# Altium footprint library IC_QFN.PcbLib: 25 footprints (part 1 of 3)
Each footprint in its own frame and in the unit in brackets; x right, y up, seen from the top. Pads: shape width x height; smd on the part's side, far side on the other; paste and mask are expansions set on the pad; w line width, h text height; cw(c..) or ccw(c..) is an arc to the next point about the centre after c.
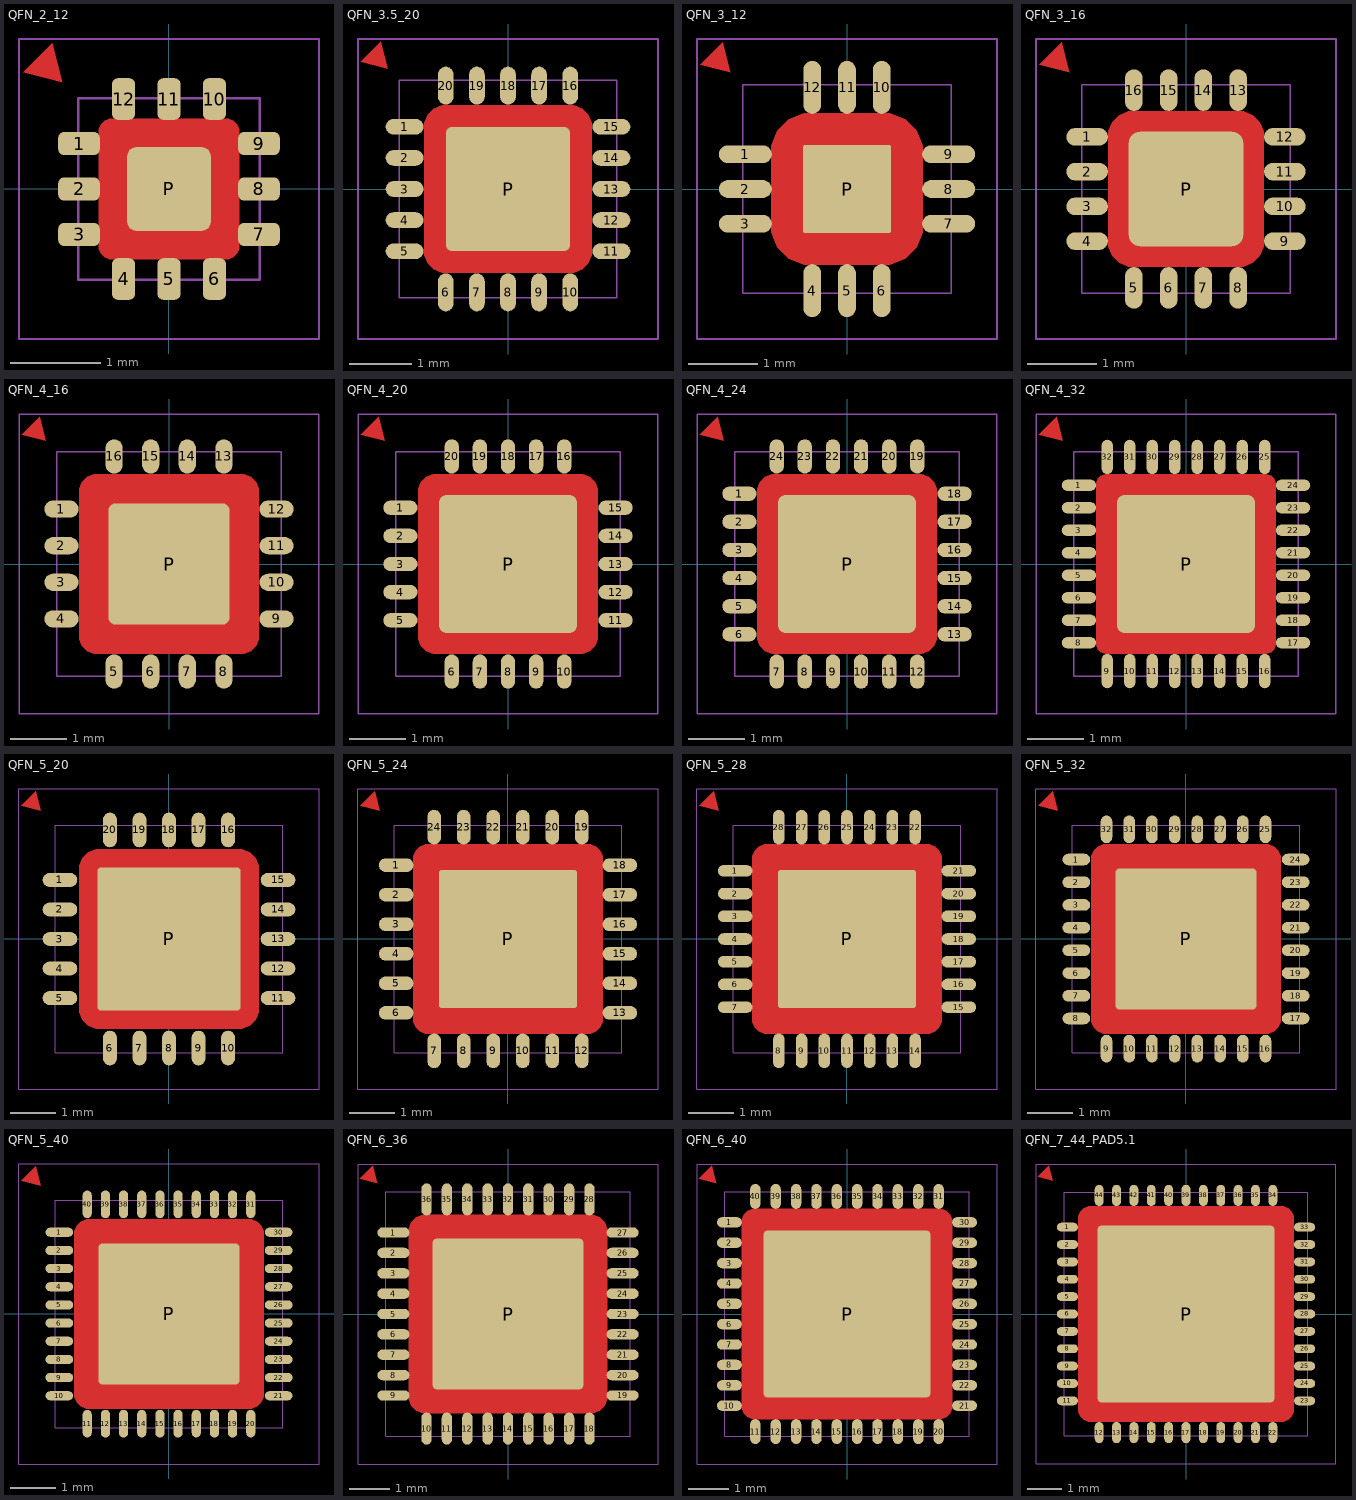
[diagram p0: the footprints below, top view; thin cyan lines are the x and y axes]

## QFN_2_12 [mil]
pads (13):
  rrect50% 18x10 smd mask+2: 1(-39,19.69) 2(-39,0) 3(-39,-19.68) 7(39,-19.69) 8(39,0) 9(39,19.68)
  rrect50% 10x18 smd mask+2: 4(-19.69,-39) 5(0,-39) 6(19.68,-39) 10(19.69,39) 11(0,39) 12(-19.68,39)
  rrect20% 36.22x36.22 smd paste-100 mask+2: P(0,0)
Top Layer:
  pour cut-out: -24.69,30.37 -25.82,30.37 -27.91,29.5 -29.5,27.91 -30.37,25.82 -30.37,24.69 -30.37,-24.69 -30.37,-25.82 -29.5,-27.91 -27.91,-29.5 -25.82,-30.37 -24.69,-30.37 24.69,-30.37 25.82,-30.37 27.91,-29.5 29.5,-27.91 30.37,-25.82 30.37,-24.69 30.37,24.69 30.37,25.82 29.5,27.91 27.91,29.5 25.82,30.37 24.69,30.37
  region: -46.26,46.26 -50.5,63.23 -63.23,50.51
Top Paste:
  region: 3,3 18,3 18,14 14,18 3,18
  region: 3,-3 3,-18 14,-18 18,-14 18,-3
  region: -3,-3 -18,-3 -18,-14 -14,-18 -3,-18
  region: -3,3 -3,18 -14,18 -18,14 -18,3
Top Component Outline:
  lines w1: -65,-65 65,-65 65,65 -65,65 -65,-65
Top 3D Body (Mech16):
  lines w1: -39.37,-39.37 -39.37,39.37 39.37,39.37 39.37,-39.37 -39.37,-39.37
3D body: height 21, standoff 0, extent -39.37,-39.37 39.37,39.37
3D body: height 10, standoff 0, extent 14.69,-40.37 24.68,-30.37
3D body: height 10, standoff 0, extent -5,-40.37 5,-30.37
3D body: height 10, standoff 0, extent -24.69,-40.37 -14.69,-30.37
3D body: height 10, standoff 0, extent -40.37,-24.68 -30.37,-14.69
3D body: height 10, standoff 0, extent -40.37,-5 -30.37,5
3D body: height 10, standoff 0, extent -40.37,14.69 -30.37,24.69
3D body: height 10, standoff 0, extent 30.37,-24.69 40.37,-14.69
3D body: height 10, standoff 0, extent 30.37,-5 40.37,5
3D body: height 10, standoff 0, extent 30.37,14.69 40.37,24.68
3D body: height 10, standoff 0, extent 14.69,30.37 24.69,40.37
3D body: height 10, standoff 0, extent -5,30.37 5,40.37
3D body: height 10, standoff 0, extent -24.68,30.37 -14.69,40.37

## QFN_3.5_20 [mil]
pads (21):
  oval 24x10 smd mask+2: 1(-65.47,39.37) 2(-65.47,19.68) 3(-65.47,0) 4(-65.47,-19.68) 5(-65.47,-39.37) 11(65.47,-39.37) 12(65.47,-19.68) 13(65.47,0) 14(65.47,19.69) 15(65.47,39.37)
  oval 10x24 smd mask+2: 6(-39.37,-65.47) 7(-19.69,-65.47) 8(0,-65.47) 9(19.68,-65.47) 10(39.37,-65.47) 16(39.37,65.47) 17(19.68,65.47) 18(0,65.47) 19(-19.69,65.47) 20(-39.37,65.47)
  rrect10% 78.74x78.74 smd paste-100 mask+2: P(0,0)
Top Layer:
  region: -76.26,76.26 -80.5,93.23 -93.23,80.51
  pour cut-out: -39.37,-53 -42.08,-53 -47.09,-50.92 -50.92,-47.09 -53,-42.08 -53,-39.37 -53,39.37 -53,42.08 -50.92,47.09 -47.09,50.92 -42.08,53 -39.37,53 39.37,53 42.08,53 47.09,50.92 50.92,47.09 53,42.08 53,39.37 53,-39.37 53,-42.08 50.92,-47.09 47.09,-50.92 42.08,-53 39.37,-53
Top Paste:
  region: 37,-6 6,-6 6,-36 37,-36
  region: -6,-36 -6,-6 -36,-6 -36,-36
  rectangle: -37,6 -6,37
  region: 6,37 6,6 37,6 37,37
Top Component Outline:
  lines w1: -95,-95 95,-95 95,95 -95,95 -95,-95
Top 3D Body (Mech16):
  lines w1: -68.9,-68.9 -68.9,68.9 68.9,68.9 68.9,-68.9 -68.9,-68.9
3D body: height 10, standoff 0, extent -44.37,-69.16 -34.37,-59.16
3D body: height 10, standoff 0, extent -24.68,-69.16 -14.68,-59.16
3D body: height 10, standoff 0, extent -5,-69.16 5,-59.16
3D body: height 10, standoff 0, extent 14.69,-69.16 24.69,-59.16
3D body: height 10, standoff 0, extent 34.37,-69.16 44.37,-59.16
3D body: height 10, standoff 0, extent -69.16,34.37 -59.16,44.37
3D body: height 10, standoff 0, extent -69.16,14.68 -59.16,24.68
3D body: height 10, standoff 0, extent -69.16,-5 -59.16,5
3D body: height 10, standoff 0, extent -69.16,-24.69 -59.16,-14.69
3D body: height 10, standoff 0, extent -69.16,-44.37 -59.16,-34.37
3D body: height 10, standoff 0, extent 34.37,59.16 44.37,69.16
3D body: height 10, standoff 0, extent 14.69,59.16 24.69,69.16
3D body: height 10, standoff 0, extent -5,59.16 5,69.16
3D body: height 10, standoff 0, extent -24.68,59.16 -14.68,69.16
3D body: height 10, standoff 0, extent -44.37,59.16 -34.37,69.16
3D body: height 10, standoff 0, extent 59.16,34.37 69.16,44.37
3D body: height 10, standoff 0, extent 59.16,14.68 69.16,24.68
3D body: height 10, standoff 0, extent 59.16,-5 69.16,5
3D body: height 10, standoff 0, extent 59.16,-24.69 69.16,-14.69
3D body: height 10, standoff 0, extent 59.16,-44.37 69.16,-34.37
3D body: height 35, standoff 0, extent -68.9,-68.9 68.9,68.9

## QFN_3_12 [mil]
pads (13):
  oval 30x10 smd mask+2: 1(-57.58,19.69) 2(-57.58,0) 3(-57.58,-19.68) 7(57.58,-19.68) 8(57.58,0) 9(57.58,19.69)
  oval 10x30 smd mask+2: 4(-19.69,-57.58) 5(0,-57.58) 6(19.68,-57.58) 10(19.68,57.58) 11(0,57.58) 12(-19.69,57.58)
  rrect5% 50x50 smd paste-100 mask+2: P(0,0)
Top Layer:
  region: -66.26,66.26 -70.5,83.23 -83.23,70.51
  pour cut-out: -20,43 -24.57,43 -33.03,39.5 -39.5,33.03 -43,24.57 -43,20 -43,-20 -43,-24.57 -39.5,-33.03 -33.03,-39.5 -24.57,-43 -20,-43 20,-43 24.57,-43 33.03,-39.5 39.5,-33.03 43,-24.57 43,-20 43,20 43,24.57 39.5,33.03 33.03,39.5 24.57,43 20,43
Top Paste:
  rectangle: -24,5 -5,24
  region: -5,-24 -5,-5 -24,-5 -24,-24
  region: 24,-5 5,-5 5,-24 24,-24
  region: 5,24 5,5 24,5 24,24
Top Component Outline:
  lines w1: -85,-85 85,-85 85,85 -85,85 -85,-85
Top 3D Body (Mech16):
  lines w1: -59.06,-59.05 59.06,-59.05 59.06,59.06 -59.06,59.06 -59.06,-59.05 ; -28.5,-28.5 -28.5,28.5 28.5,28.5 28.5,-28.5 -28.5,-28.5
3D body: height 35, standoff 0, extent -59.06,-59.05 59.06,59.06
3D body: height 10, standoff 0, extent -60.06,14.69 -50.06,24.69
3D body: height 10, standoff 0, extent -60.06,-5 -50.06,5
3D body: height 10, standoff 0, extent -60.06,-24.68 -50.06,-14.69
3D body: height 10, standoff 0, extent 14.69,-60.06 24.68,-50.06
3D body: height 10, standoff 0, extent -5,-60.06 5,-50.06
3D body: height 10, standoff 0, extent -24.69,-60.06 -14.69,-50.06
3D body: height 10, standoff 0, extent 50.06,14.69 60.06,24.69
3D body: height 10, standoff 0, extent 50.06,-5 60.06,5
3D body: height 10, standoff 0, extent 50.06,-24.68 60.06,-14.69
3D body: height 10, standoff 0, extent -24.69,50.06 -14.69,60.06
3D body: height 10, standoff 0, extent -5,50.06 5,60.06
3D body: height 10, standoff 0, extent 14.69,50.06 24.68,60.06

## QFN_3_16 [mil]
pads (17):
  oval 23.62x10 smd paste+0 mask+2: 1(-56,29.53) 2(-56,9.84) 3(-56,-9.84) 4(-56,-29.53) 9(56,-29.52) 10(56,-9.84) 11(56,9.85) 12(56,29.53)
  oval 10x23.62 smd paste+0 mask+2: 5(-29.52,-56) 6(-9.84,-56) 7(9.85,-56) 8(29.53,-56) 13(29.52,56) 14(9.84,56) 15(-9.85,56) 16(-29.53,56)
  rrect20% 64.96x64.96 smd paste-200 mask+2: P(0,0)
Top Layer:
  pour cut-out: -44,-30 -44,-32.78 -41.87,-37.93 -37.93,-41.87 -32.78,-44 -30,-44 30,-44 32.78,-44 37.93,-41.87 41.87,-37.93 44,-32.78 44,-30 44,30 44,32.78 41.87,37.93 37.93,41.87 32.78,44 30,44 -30,44 -32.78,44 -37.93,41.87 -41.87,37.93 -44,32.78 -44,30
  region: -66.26,66.26 -70.5,83.23 -83.23,70.51
Top Paste:
  region: 32,4 32,26 32,27.19 31.09,29.4 29.4,31.09 27.19,32 26,32 4,32 4,4
  region: 4,-32 26,-32 27.19,-32 29.4,-31.09 31.09,-29.4 32,-27.19 32,-26 32,-4 4,-4
  region: -32,-4 -32,-26 -32,-27.19 -31.09,-29.4 -29.4,-31.09 -27.19,-32 -26,-32 -4,-32 -4,-4
  region: -4,32 -26,32 -27.19,32 -29.4,31.09 -31.09,29.4 -32,27.19 -32,26 -32,4 -4,4
Top Component Outline:
  lines w1: -85,-85 -85,85 85,85 85,-85 -85,-85
Top 3D Body (Mech16):
  lines w1: -59.06,-59.05 59.06,-59.05 59.06,59.06 -59.06,59.06 -59.06,-59.05
3D body: height 35, standoff 0, extent -59.06,-59.05 59.06,59.06
3D body: height 10, standoff 0, extent -60.06,24.53 -50.06,34.53
3D body: height 10, standoff 0, extent -60.06,4.84 -50.06,14.84
3D body: height 10, standoff 0, extent -60.06,-14.84 -50.06,-4.84
3D body: height 10, standoff 0, extent -60.06,-34.53 -50.06,-24.53
3D body: height 10, standoff 0, extent 24.53,-60.06 34.53,-50.06
3D body: height 10, standoff 0, extent 4.84,-60.06 14.84,-50.06
3D body: height 10, standoff 0, extent -14.84,-60.06 -4.84,-50.06
3D body: height 10, standoff 0, extent -34.53,-60.06 -24.53,-50.06
3D body: height 10, standoff 0, extent 50.06,24.53 60.06,34.53
3D body: height 10, standoff 0, extent 50.06,4.84 60.06,14.84
3D body: height 10, standoff 0, extent 50.06,-14.84 60.06,-4.84
3D body: height 10, standoff 0, extent 50.06,-34.53 60.06,-24.53
3D body: height 10, standoff 0, extent -34.53,50.06 -24.53,60.06
3D body: height 10, standoff 0, extent -14.84,50.06 -4.84,60.06
3D body: height 10, standoff 0, extent 4.84,50.06 14.84,60.06
3D body: height 10, standoff 0, extent 24.53,50.06 34.53,60.06

## QFN_4_16 [mm]
pads (17):
  oval 0.61x0.305 smd mask+0.051: 1(-1.913,0.975) 2(-1.913,0.325) 3(-1.913,-0.325) 4(-1.913,-0.975) 9(1.913,-0.975) 10(1.913,-0.325) 11(1.913,0.325) 12(1.913,0.975)
  oval 0.305x0.61 smd mask+0.051: 5(-0.975,-1.913) 6(-0.325,-1.913) 7(0.325,-1.913) 8(0.975,-1.913) 13(0.975,1.913) 14(0.325,1.913) 15(-0.325,1.913) 16(-0.975,1.913)
  rrect10% 2.15x2.15 smd paste-2.54 mask+0.051: P(0,0)
Top Layer:
  region: -2.191,2.191 -2.299,2.622 -2.622,2.299
  pour cut-out: -1.27,1.6 -1.336,1.6 -1.457,1.55 -1.55,1.457 -1.6,1.336 -1.6,1.27 -1.6,-1.27 -1.6,-1.336 -1.55,-1.457 -1.457,-1.55 -1.336,-1.6 -1.27,-1.6 1.27,-1.6 1.336,-1.6 1.457,-1.55 1.55,-1.457 1.6,-1.336 1.6,-1.27 1.6,1.27 1.6,1.336 1.55,1.457 1.457,1.55 1.336,1.6 1.27,1.6
Top Paste:
  region: 0.152,1.041 0.152,0.152 1.041,0.152 1.041,1.041
  rectangle: -1.041,0.152 -0.152,1.041
  region: -0.152,-1.041 -0.152,-0.152 -1.041,-0.152 -1.041,-1.041
  region: 1.041,-0.152 0.152,-0.152 0.152,-1.041 1.041,-1.041
Top Component Outline:
  lines w0.025: -2.667,-2.667 -2.667,2.667 2.667,2.667 2.667,-2.667 -2.667,-2.667
Top 3D Body (Mech16):
  lines w0.025: -2,-2 2,-2 2,2 -2,2 -2,-2
3D body: height 0.25, standoff 0, extent 1.626,-1.102 1.88,-0.848
3D body: height 0.25, standoff 0, extent 1.626,-0.452 1.88,-0.198
3D body: height 0.25, standoff 0, extent 1.626,0.198 1.88,0.452
3D body: height 0.25, standoff 0, extent 1.626,0.848 1.88,1.102
3D body: height 0.25, standoff 0, extent -1.102,-1.88 -0.848,-1.626
3D body: height 0.25, standoff 0, extent -0.452,-1.88 -0.198,-1.626
3D body: height 0.25, standoff 0, extent 0.198,-1.88 0.452,-1.626
3D body: height 0.25, standoff 0, extent 0.848,-1.88 1.102,-1.626
3D body: height 0.25, standoff 0, extent -1.88,0.848 -1.626,1.102
3D body: height 0.25, standoff 0, extent -1.88,0.198 -1.626,0.452
3D body: height 0.25, standoff 0, extent -1.88,-0.452 -1.626,-0.198
3D body: height 0.25, standoff 0, extent -1.88,-1.102 -1.626,-0.848
3D body: height 0.25, standoff 0, extent -1.102,1.626 -0.848,1.88
3D body: height 0.25, standoff 0, extent -0.452,1.626 -0.198,1.88
3D body: height 0.25, standoff 0, extent 0.198,1.626 0.452,1.88
3D body: height 0.25, standoff 0, extent 0.848,1.626 1.102,1.88
3D body: height 0.89, standoff 0, extent -2,-2 2,2

## QFN_4_20 [mil]
pads (21):
  oval 24x10 smd mask+2: 1(-75.31,39.37) 2(-75.31,19.68) 3(-75.31,0) 4(-75.31,-19.68) 5(-75.31,-39.37) 11(75.31,-39.37) 12(75.31,-19.68) 13(75.31,0) 14(75.31,19.69) 15(75.31,39.37)
  oval 10x24 smd mask+2: 6(-39.37,-75.31) 7(-19.69,-75.31) 8(0,-75.31) 9(19.68,-75.31) 10(39.37,-75.31) 16(39.37,75.31) 17(19.68,75.31) 18(0,75.31) 19(-19.69,75.31) 20(-39.37,75.31)
  rrect10% 96.46x96.46 smd paste-100 mask+2: P(0,0)
Top Layer:
  pour cut-out: -50,63 -52.59,63 -57.36,61.02 -61.02,57.36 -63,52.59 -63,50 -63,-50 -63,-52.59 -61.02,-57.36 -57.36,-61.02 -52.59,-63 -50,-63 50,-63 52.59,-63 57.36,-61.02 61.02,-57.36 63,-52.59 63,-50 63,50 63,52.59 61.02,57.36 57.36,61.02 52.59,63 50,63
  region: -86.26,86.26 -90.5,103.23 -103.23,90.51
Top Paste:
  region: 6,41 6,6 41,6 41,41
  rectangle: -41,6 -6,41
  region: -6,-41 -6,-6 -41,-6 -41,-41
  region: 41,-6 6,-6 6,-41 41,-41
Top Component Outline:
  lines w1: -105,-105 105,-105 105,105 -105,105 -105,-105
Top 3D Body (Mech16):
  lines w1: -78.74,-78.74 -78.74,78.74 78.74,78.74 78.74,-78.74 -78.74,-78.74
3D body: height 35, standoff 0, extent -78.74,-78.74 78.74,78.74
3D body: height 10, standoff 0, extent 69,-44.37 79,-34.37
3D body: height 10, standoff 0, extent 69,-24.69 79,-14.69
3D body: height 10, standoff 0, extent 69,-5 79,5
3D body: height 10, standoff 0, extent 69,14.68 79,24.68
3D body: height 10, standoff 0, extent 69,34.37 79,44.37
3D body: height 10, standoff 0, extent -44.37,69 -34.37,79
3D body: height 10, standoff 0, extent -24.68,69 -14.68,79
3D body: height 10, standoff 0, extent -5,69 5,79
3D body: height 10, standoff 0, extent 14.69,69 24.69,79
3D body: height 10, standoff 0, extent 34.37,69 44.37,79
3D body: height 10, standoff 0, extent -79,-44.37 -69,-34.37
3D body: height 10, standoff 0, extent -79,-24.69 -69,-14.69
3D body: height 10, standoff 0, extent -79,-5 -69,5
3D body: height 10, standoff 0, extent -79,14.68 -69,24.68
3D body: height 10, standoff 0, extent -79,34.37 -69,44.37
3D body: height 10, standoff 0, extent 34.37,-79 44.37,-69
3D body: height 10, standoff 0, extent 14.69,-79 24.69,-69
3D body: height 10, standoff 0, extent -5,-79 5,-69
3D body: height 10, standoff 0, extent -24.68,-79 -14.68,-69
3D body: height 10, standoff 0, extent -44.37,-79 -34.37,-69

## QFN_4_24 [mil]
pads (25):
  oval 24x10 smd mask+2: 1(-75.31,49.21) 2(-75.31,29.53) 3(-75.31,9.84) 4(-75.31,-9.84) 5(-75.31,-29.53) 6(-75.31,-49.21) 13(75.31,-49.21) 14(75.31,-29.53) 15(75.31,-9.84) 16(75.31,9.84) 17(75.31,29.53) 18(75.31,49.21)
  oval 10x24 smd mask+2: 7(-49.21,-75.31) 8(-29.53,-75.31) 9(-9.84,-75.31) 10(9.84,-75.31) 11(29.53,-75.31) 12(49.21,-75.31) 19(49.21,75.31) 20(29.53,75.31) 21(9.84,75.31) 22(-9.84,75.31) 23(-29.53,75.31) 24(-49.21,75.31)
  rrect10% 96.46x96.46 smd paste-100 mask+2: P(0,0)
Top Layer:
  pour cut-out: -50,63 -52.59,63 -57.36,61.02 -61.02,57.36 -63,52.59 -63,50 -63,-50 -63,-52.59 -61.02,-57.36 -57.36,-61.02 -52.59,-63 -50,-63 50,-63 52.59,-63 57.36,-61.02 61.02,-57.36 63,-52.59 63,-50 63,50 63,52.59 61.02,57.36 57.36,61.02 52.59,63 50,63
  region: -86.26,86.26 -90.5,103.23 -103.23,90.51
Top Paste:
  region: 41,-6 6,-6 6,-41 41,-41
  region: -6,-41 -6,-6 -41,-6 -41,-41
  rectangle: -41,6 -6,41
  region: 6,41 6,6 41,6 41,41
Top Component Outline:
  lines w1: -105,-105 -105,105 105,105 105,-105 -105,-105
Top 3D Body (Mech16):
  lines w1: -78.74,-78.74 78.74,-78.74 78.74,78.74 -78.74,78.74 -78.74,-78.74
3D body: height 10, standoff 0, extent -54.21,-79 -44.21,-69
3D body: height 10, standoff 0, extent -34.53,-79 -24.53,-69
3D body: height 10, standoff 0, extent -14.84,-79 -4.84,-69
3D body: height 10, standoff 0, extent 4.84,-79 14.84,-69
3D body: height 10, standoff 0, extent 24.53,-79 34.53,-69
3D body: height 10, standoff 0, extent 44.21,-79 54.21,-69
3D body: height 10, standoff 0, extent -79,44.21 -69,54.21
3D body: height 10, standoff 0, extent -79,24.53 -69,34.53
3D body: height 10, standoff 0, extent -79,4.84 -69,14.84
3D body: height 10, standoff 0, extent -79,-14.84 -69,-4.84
3D body: height 10, standoff 0, extent -79,-34.53 -69,-24.53
3D body: height 10, standoff 0, extent -79,-54.21 -69,-44.21
3D body: height 10, standoff 0, extent 44.21,69 54.21,79
3D body: height 10, standoff 0, extent 24.53,69 34.53,79
3D body: height 10, standoff 0, extent 4.84,69 14.84,79
3D body: height 10, standoff 0, extent -14.84,69 -4.84,79
3D body: height 10, standoff 0, extent -34.53,69 -24.53,79
3D body: height 10, standoff 0, extent -54.21,69 -44.21,79
3D body: height 10, standoff 0, extent 69,44.21 79,54.21
3D body: height 10, standoff 0, extent 69,24.53 79,34.53
3D body: height 10, standoff 0, extent 69,4.84 79,14.84
3D body: height 10, standoff 0, extent 69,-14.84 79,-4.84
3D body: height 10, standoff 0, extent 69,-34.53 79,-24.53
3D body: height 10, standoff 0, extent 69,-54.21 79,-44.21
3D body: height 35, standoff 0, extent -78.74,-78.74 78.74,78.74

## QFN_4_32 [mm]
pads (33):
  oval 0.61x0.2 smd mask+0.051: 1(-1.905,1.4) 2(-1.905,1) 3(-1.905,0.6) 4(-1.905,0.2) 5(-1.905,-0.2) 6(-1.905,-0.6) 7(-1.905,-1) 8(-1.905,-1.4) 17(1.905,-1.4) 18(1.905,-1) 19(1.905,-0.6) 20(1.905,-0.2) 21(1.905,0.2) 22(1.905,0.6) 23(1.905,1) 24(1.905,1.4)
  oval 0.2x0.61 smd mask+0.051: 9(-1.4,-1.905) 10(-1,-1.905) 11(-0.6,-1.905) 12(-0.2,-1.905) 13(0.2,-1.905) 14(0.6,-1.905) 15(1,-1.905) 16(1.4,-1.905) 25(1.4,1.905) 26(1,1.905) 27(0.6,1.905) 28(0.2,1.905) 29(-0.2,1.905) 30(-0.6,1.905) 31(-1,1.905) 32(-1.4,1.905)
  rrect10% 2.45x2.45 smd paste-2.54 mask+0.051: P(0,0)
Top Layer:
  pour cut-out: -1.397,1.6 -1.437,1.6 -1.512,1.569 -1.569,1.512 -1.6,1.437 -1.6,1.397 -1.6,-1.397 -1.6,-1.437 -1.569,-1.512 -1.512,-1.569 -1.437,-1.6 -1.397,-1.6 1.397,-1.6 1.437,-1.6 1.512,-1.569 1.569,-1.512 1.6,-1.437 1.6,-1.397 1.6,1.397 1.6,1.437 1.569,1.512 1.512,1.569 1.437,1.6 1.397,1.6
  region: -2.191,2.191 -2.299,2.622 -2.622,2.299
Top Paste:
  region: 0.152,1.041 0.152,0.152 1.041,0.152 1.041,1.041
  rectangle: -1.041,0.152 -0.152,1.041
  region: -0.152,-1.041 -0.152,-0.152 -1.041,-0.152 -1.041,-1.041
  region: 1.041,-0.152 0.152,-0.152 0.152,-1.041 1.041,-1.041
Top Component Outline:
  lines w0.025: -2.667,-2.667 2.667,-2.667 2.667,2.667 -2.667,2.667 -2.667,-2.667
Top 3D Body (Mech16):
  lines w0.025: -2,-2 -2,2 2,2 2,-2 -2,-2
3D body: height 0.25, standoff 0, extent -0.302,1.753 -0.098,2.007
3D body: height 0.25, standoff 0, extent 0.098,1.753 0.302,2.007
3D body: height 0.25, standoff 0, extent 0.498,1.753 0.702,2.007
3D body: height 0.25, standoff 0, extent 0.898,1.753 1.102,2.007
3D body: height 0.25, standoff 0, extent 1.298,1.753 1.502,2.007
3D body: height 0.25, standoff 0, extent -0.702,1.753 -0.498,2.007
3D body: height 0.25, standoff 0, extent -1.102,1.753 -0.898,2.007
3D body: height 0.25, standoff 0, extent -1.502,1.753 -1.298,2.007
3D body: height 0.25, standoff 0, extent 1.753,0.098 2.007,0.302
3D body: height 0.25, standoff 0, extent 1.753,-0.302 2.007,-0.098
3D body: height 0.25, standoff 0, extent 1.753,-0.702 2.007,-0.498
3D body: height 0.25, standoff 0, extent 1.753,-1.102 2.007,-0.898
3D body: height 0.25, standoff 0, extent 1.753,-1.502 2.007,-1.298
3D body: height 0.25, standoff 0, extent 1.753,0.498 2.007,0.702
3D body: height 0.25, standoff 0, extent 1.753,0.898 2.007,1.102
3D body: height 0.25, standoff 0, extent 1.753,1.298 2.007,1.502
3D body: height 0.25, standoff 0, extent 0.098,-2.007 0.302,-1.753
3D body: height 0.25, standoff 0, extent -0.302,-2.007 -0.098,-1.753
3D body: height 0.25, standoff 0, extent -0.702,-2.007 -0.498,-1.753
3D body: height 0.25, standoff 0, extent -1.102,-2.007 -0.898,-1.753
3D body: height 0.25, standoff 0, extent -1.502,-2.007 -1.298,-1.753
3D body: height 0.25, standoff 0, extent 0.498,-2.007 0.702,-1.753
3D body: height 0.25, standoff 0, extent 0.898,-2.007 1.102,-1.753
3D body: height 0.25, standoff 0, extent 1.298,-2.007 1.502,-1.753
3D body: height 0.25, standoff 0, extent -2.007,-1.502 -1.753,-1.298
3D body: height 0.25, standoff 0, extent -2.007,-1.102 -1.753,-0.898
3D body: height 0.25, standoff 0, extent -2.007,-0.702 -1.753,-0.498
3D body: height 0.25, standoff 0, extent -2.007,1.298 -1.753,1.502
3D body: height 0.25, standoff 0, extent -2.007,0.898 -1.753,1.102
3D body: height 0.25, standoff 0, extent -2.007,0.498 -1.753,0.702
3D body: height 0.25, standoff 0, extent -2.007,0.098 -1.753,0.302
3D body: height 0.25, standoff 0, extent -2.007,-0.302 -1.753,-0.098
3D body: height 0.89, standoff 0, extent -2,-2 2,2

## QFN_5_20 [mil]
pads (21):
  oval 30x12 smd mask+2: 1(-94.49,51.18) 2(-94.49,25.59) 3(-94.49,0) 4(-94.49,-25.59) 5(-94.49,-51.18) 11(94.49,-51.18) 12(94.49,-25.59) 13(94.49,0) 14(94.49,25.59) 15(94.49,51.18)
  oval 12x30 smd mask+2: 6(-51.18,-94.49) 7(-25.59,-94.49) 8(0,-94.49) 9(25.59,-94.49) 10(51.18,-94.49) 16(51.18,94.49) 17(25.59,94.49) 18(0,94.49) 19(-25.59,94.49) 20(-51.18,94.49)
  rrect5% 124x124 smd paste-200 mask+2: P(0,0)
Top Layer:
  region: -111.26,111.26 -115.5,128.23 -128.23,115.51
  pour cut-out: -60,78 -63.58,78 -70.2,75.26 -75.26,70.2 -78,63.58 -78,60 -78,-60 -78,-63.58 -75.26,-70.2 -70.2,-75.26 -63.58,-78 -60,-78 60,-78 63.58,-78 70.2,-75.26 75.26,-70.2 78,-63.58 78,-60 78,60 78,63.58 75.26,70.2 70.2,75.26 63.58,78 60,78
Top Paste:
  region: 25,-25 25,-59 59,-59 59,-25
  region: -17,-25 -17,-59 17,-59 17,-25
  region: -25,-25 -59,-25 -59,-59 -25,-59
  region: -25,17 -59,17 -59,-17 -25,-17
  region: -25,25 -25,59 -59,59 -59,25
  rectangle: 25,25 59,59
  rectangle: 25,-17 59,17
  rectangle: -17,25 17,59
  rectangle: -17,-17 17,17
Top Component Outline:
  lines w1: -130,-130 130,-130 130,130 -130,130 -130,-130
Top 3D Body (Mech16):
  lines w1: -98.43,-98.43 98.43,-98.43 98.43,98.43 -98.43,98.43 -98.43,-98.43
3D body: height 35, standoff 0, extent -98.43,-98.43 98.43,98.43
3D body: height 10, standoff 0, extent -98.69,-30.59 -88.69,-20.59
3D body: height 10, standoff 0, extent -98.69,-5 -88.69,5
3D body: height 10, standoff 0, extent -98.69,20.59 -88.69,30.59
3D body: height 10, standoff 0, extent -98.69,46.18 -88.69,56.18
3D body: height 10, standoff 0, extent -98.69,-56.18 -88.69,-46.18
3D body: height 10, standoff 0, extent 46.18,-98.69 56.18,-88.69
3D body: height 10, standoff 0, extent -56.18,-98.69 -46.18,-88.69
3D body: height 10, standoff 0, extent -30.59,-98.69 -20.59,-88.69
3D body: height 10, standoff 0, extent -5,-98.69 5,-88.69
3D body: height 10, standoff 0, extent 20.59,-98.69 30.59,-88.69
3D body: height 10, standoff 0, extent 88.69,46.18 98.69,56.18
3D body: height 10, standoff 0, extent 88.69,-56.18 98.69,-46.18
3D body: height 10, standoff 0, extent 88.69,-30.59 98.69,-20.59
3D body: height 10, standoff 0, extent 88.69,-5 98.69,5
3D body: height 10, standoff 0, extent 88.69,20.59 98.69,30.59
3D body: height 10, standoff 0, extent -56.18,88.69 -46.18,98.69
3D body: height 10, standoff 0, extent 46.18,88.69 56.18,98.69
3D body: height 10, standoff 0, extent 20.59,88.69 30.59,98.69
3D body: height 10, standoff 0, extent -5,88.69 5,98.69
3D body: height 10, standoff 0, extent -30.59,88.69 -20.59,98.69

## QFN_5_24 [mil]
pads (25):
  oval 30x12 smd mask+2: 1(-96.94,63.98) 2(-96.94,38.39) 3(-96.94,12.8) 4(-96.94,-12.8) 5(-96.94,-38.39) 6(-96.94,-63.98) 13(96.94,-63.98) 14(96.94,-38.39) 15(96.94,-12.8) 16(96.94,12.8) 17(96.94,38.39) 18(96.94,63.98)
  oval 12x30 smd mask+2: 7(-63.98,-96.94) 8(-38.39,-96.94) 9(-12.8,-96.94) 10(12.8,-96.94) 11(38.39,-96.94) 12(63.98,-96.94) 19(63.98,96.94) 20(38.39,96.94) 21(12.8,96.94) 22(-12.8,96.94) 23(-38.39,96.94) 24(-63.98,96.94)
  rrect5% 120x120 smd paste-200 mask+2: P(0,0)
Top Layer:
  region: -111.26,111.26 -115.5,128.23 -128.23,115.51
  pour cut-out: -69,82 -71.59,82 -76.36,80.02 -80.02,76.36 -82,71.59 -82,69 -82,-69 -82,-71.59 -80.02,-76.36 -76.36,-80.02 -71.59,-82 -69,-82 69,-82 71.59,-82 76.36,-80.02 80.02,-76.36 82,-71.59 82,-69 82,69 82,71.59 80.02,76.36 76.36,80.02 71.59,82 69,82
Top Paste:
  rectangle: -17,-17 17,17
  rectangle: -17,25 17,59
  rectangle: 25,-17 59,17
  rectangle: 25,25 59,59
  region: -25,25 -25,59 -59,59 -59,25
  region: -25,17 -59,17 -59,-17 -25,-17
  region: -25,-25 -59,-25 -59,-59 -25,-59
  region: -17,-25 -17,-59 17,-59 17,-25
  region: 25,-25 25,-59 59,-59 59,-25
Top Component Outline:
  lines w1: -130,-130 130,-130 130,130 -130,130 -130,-130
Top 3D Body (Mech16):
  lines w1: -98.43,-98.43 98.43,-98.43 98.43,98.43 -98.43,98.43 -98.43,-98.43
3D body: height 35, standoff 0, extent -98.43,-98.43 98.43,98.43
3D body: height 10, standoff 0, extent -99,58.98 -89,68.98
3D body: height 10, standoff 0, extent -99,33.39 -89,43.39
3D body: height 10, standoff 0, extent -99,7.8 -89,17.8
3D body: height 10, standoff 0, extent -99,-17.79 -89,-7.79
3D body: height 10, standoff 0, extent -99,-43.39 -89,-33.39
3D body: height 10, standoff 0, extent -99,-68.98 -89,-58.98
3D body: height 10, standoff 0, extent 58.98,-99 68.98,-89
3D body: height 10, standoff 0, extent 33.39,-99 43.39,-89
3D body: height 10, standoff 0, extent 7.79,-99 17.79,-89
3D body: height 10, standoff 0, extent -17.8,-99 -7.8,-89
3D body: height 10, standoff 0, extent -43.39,-99 -33.39,-89
3D body: height 10, standoff 0, extent -68.98,-99 -58.98,-89
3D body: height 10, standoff 0, extent 89,58.98 99,68.98
3D body: height 10, standoff 0, extent 89,33.39 99,43.39
3D body: height 10, standoff 0, extent 89,7.79 99,17.79
3D body: height 10, standoff 0, extent 89,-17.8 99,-7.8
3D body: height 10, standoff 0, extent 89,-43.39 99,-33.39
3D body: height 10, standoff 0, extent 89,-68.98 99,-58.98
3D body: height 10, standoff 0, extent -68.98,89 -58.98,99
3D body: height 10, standoff 0, extent -43.38,89 -33.38,99
3D body: height 10, standoff 0, extent -17.79,89 -7.79,99
3D body: height 10, standoff 0, extent 7.8,89 17.8,99
3D body: height 10, standoff 0, extent 33.39,89 43.39,99
3D body: height 10, standoff 0, extent 58.98,89 68.98,99

## QFN_5_28 [mil]
pads (29):
  oval 30x10 smd mask+2: 1(-96.94,59.05) 2(-96.94,39.37) 3(-96.94,19.68) 4(-96.94,0) 5(-96.94,-19.69) 6(-96.94,-39.37) 7(-96.94,-59.06) 15(96.94,-59.06) 16(96.94,-39.37) 17(96.94,-19.69) 18(96.94,0) 19(96.94,19.68) 20(96.94,39.37) 21(96.94,59.05)
  oval 10x30 smd mask+2: 8(-59.05,-96.94) 9(-39.37,-96.94) 10(-19.68,-96.94) 11(0,-96.94) 12(19.69,-96.94) 13(39.37,-96.94) 14(59.06,-96.94) 22(59.06,96.94) 23(39.37,96.94) 24(19.69,96.94) 25(0,96.94) 26(-19.68,96.94) 27(-39.37,96.94) 28(-59.05,96.94)
  rrect5% 120x120 smd paste-200 mask+2: P(0,0)
Top Layer:
  region: -111.26,111.26 -115.5,128.23 -128.23,115.51
  pour cut-out: -69,82 -71.59,82 -76.36,80.02 -80.02,76.36 -82,71.59 -82,69 -82,-69 -82,-71.59 -80.02,-76.36 -76.36,-80.02 -71.59,-82 -69,-82 69,-82 71.59,-82 76.36,-80.02 80.02,-76.36 82,-71.59 82,-69 82,69 82,71.59 80.02,76.36 76.36,80.02 71.59,82 69,82
Top Paste:
  rectangle: -17,-17 17,17
  rectangle: -17,25 17,59
  rectangle: 25,-17 59,17
  rectangle: 25,25 59,59
  region: -25,25 -25,59 -59,59 -59,25
  region: -25,17 -59,17 -59,-17 -25,-17
  region: -25,-25 -59,-25 -59,-59 -25,-59
  region: -17,-25 -17,-59 17,-59 17,-25
  region: 25,-25 25,-59 59,-59 59,-25
Top Component Outline:
  lines w1: -130,-130 130,-130 130,130 -130,130 -130,-130
Top 3D Body (Mech16):
  lines w1: -98.43,-98.43 98.43,-98.43 98.43,98.43 -98.43,98.43 -98.43,-98.43
3D body: height 35, standoff 0, extent -98.43,-98.43 98.43,98.43
3D body: height 10, standoff 0, extent -99,54.06 -89,64.06
3D body: height 10, standoff 0, extent -99,34.37 -89,44.37
3D body: height 10, standoff 0, extent -99,-64.05 -89,-54.05
3D body: height 10, standoff 0, extent -99,-44.37 -89,-34.37
3D body: height 10, standoff 0, extent -99,-24.68 -89,-14.68
3D body: height 10, standoff 0, extent -99,-5 -89,5
3D body: height 10, standoff 0, extent -99,14.69 -89,24.69
3D body: height 10, standoff 0, extent -64.06,-99 -54.06,-89
3D body: height 10, standoff 0, extent -44.37,-99 -34.37,-89
3D body: height 10, standoff 0, extent 54.05,-99 64.05,-89
3D body: height 10, standoff 0, extent 34.37,-99 44.37,-89
3D body: height 10, standoff 0, extent 14.68,-99 24.68,-89
3D body: height 10, standoff 0, extent -5,-99 5,-89
3D body: height 10, standoff 0, extent -24.69,-99 -14.69,-89
3D body: height 10, standoff 0, extent 89,-64.06 99,-54.06
3D body: height 10, standoff 0, extent 89,-44.37 99,-34.37
3D body: height 10, standoff 0, extent 89,54.05 99,64.05
3D body: height 10, standoff 0, extent 89,34.37 99,44.37
3D body: height 10, standoff 0, extent 89,14.68 99,24.68
3D body: height 10, standoff 0, extent 89,-5 99,5
3D body: height 10, standoff 0, extent 89,-24.69 99,-14.69
3D body: height 10, standoff 0, extent 54.06,89 64.06,99
3D body: height 10, standoff 0, extent 34.37,89 44.37,99
3D body: height 10, standoff 0, extent -64.05,89 -54.05,99
3D body: height 10, standoff 0, extent -44.37,89 -34.37,99
3D body: height 10, standoff 0, extent -24.68,89 -14.68,99
3D body: height 10, standoff 0, extent -5,89 5,99
3D body: height 10, standoff 0, extent 14.69,89 24.69,99

## QFN_5_32 [mil]
pads (33):
  oval 24x10 smd mask+2: 1(-95,68.9) 2(-95,49.21) 3(-95,29.53) 4(-95,9.84) 5(-95,-9.84) 6(-95,-29.53) 7(-95,-49.21) 8(-95,-68.9) 17(95,-68.9) 18(95,-49.21) 19(95,-29.53) 20(95,-9.84) 21(95,9.84) 22(95,29.53) 23(95,49.21) 24(95,68.9)
  oval 10x24 smd mask+2: 9(-68.9,-95) 10(-49.21,-95) 11(-29.53,-95) 12(-9.84,-95) 13(9.84,-95) 14(29.53,-95) 15(49.21,-95) 16(68.9,-95) 25(68.9,95) 26(49.21,95) 27(29.53,95) 28(9.84,95) 29(-9.84,95) 30(-29.53,95) 31(-49.21,95) 32(-68.9,95)
  rrect5% 122x122 smd paste-200 mask+2: P(0,0)
Top Layer:
  pour cut-out: -69,82 -71.59,82 -76.36,80.02 -80.02,76.36 -82,71.59 -82,69 -82,-69 -82,-71.59 -80.02,-76.36 -76.36,-80.02 -71.59,-82 -69,-82 69,-82 71.59,-82 76.36,-80.02 80.02,-76.36 82,-71.59 82,-69 82,69 82,71.59 80.02,76.36 76.36,80.02 71.59,82 69,82
  region: -111.26,111.26 -115.5,128.23 -128.23,115.51
Top Paste:
  rectangle: -17,-17 17,17
  rectangle: -17,25 17,59
  rectangle: 25,-17 59,17
  rectangle: 25,25 59,59
  region: -25,25 -25,59 -59,59 -59,25
  region: -25,17 -59,17 -59,-17 -25,-17
  region: -25,-25 -59,-25 -59,-59 -25,-59
  region: -17,-25 -17,-59 17,-59 17,-25
  region: 25,-25 25,-59 59,-59 59,-25
Top Component Outline:
  lines w1: -130,-130 130,-130 130,130 -130,130 -130,-130
Top 3D Body (Mech16):
  lines w1: -98.43,-98.43 -98.43,98.43 98.43,98.43 98.43,-98.43 -98.43,-98.43
3D body: height 35, standoff 0, extent -98.43,-98.43 98.43,98.43
3D body: height 10, standoff 0, extent 89,-34.53 99,-24.53
3D body: height 10, standoff 0, extent 89,-14.84 99,-4.84
3D body: height 10, standoff 0, extent 89,4.84 99,14.84
3D body: height 10, standoff 0, extent 89,24.53 99,34.53
3D body: height 10, standoff 0, extent 89,44.21 99,54.21
3D body: height 10, standoff 0, extent 89,63.9 99,73.9
3D body: height 10, standoff 0, extent 89,-54.21 99,-44.21
3D body: height 10, standoff 0, extent 89,-73.9 99,-63.9
3D body: height 10, standoff 0, extent 63.9,89 73.9,99
3D body: height 10, standoff 0, extent 44.21,89 54.21,99
3D body: height 10, standoff 0, extent -73.9,89 -63.9,99
3D body: height 10, standoff 0, extent -54.21,89 -44.21,99
3D body: height 10, standoff 0, extent -34.53,89 -24.53,99
3D body: height 10, standoff 0, extent -14.84,89 -4.84,99
3D body: height 10, standoff 0, extent 4.84,89 14.84,99
3D body: height 10, standoff 0, extent 24.53,89 34.53,99
3D body: height 10, standoff 0, extent -99,63.9 -89,73.9
3D body: height 10, standoff 0, extent -99,44.21 -89,54.21
3D body: height 10, standoff 0, extent -99,-73.9 -89,-63.9
3D body: height 10, standoff 0, extent -99,-54.21 -89,-44.21
3D body: height 10, standoff 0, extent -99,-34.53 -89,-24.53
3D body: height 10, standoff 0, extent -99,-14.84 -89,-4.84
3D body: height 10, standoff 0, extent -99,4.84 -89,14.84
3D body: height 10, standoff 0, extent -99,24.53 -89,34.53
3D body: height 10, standoff 0, extent -73.9,-99 -63.9,-89
3D body: height 10, standoff 0, extent -54.21,-99 -44.21,-89
3D body: height 10, standoff 0, extent 63.9,-99 73.9,-89
3D body: height 10, standoff 0, extent 44.21,-99 54.21,-89
3D body: height 10, standoff 0, extent 24.53,-99 34.53,-89
3D body: height 10, standoff 0, extent 4.84,-99 14.84,-89
3D body: height 10, standoff 0, extent -14.84,-99 -4.84,-89
3D body: height 10, standoff 0, extent -34.53,-99 -24.53,-89

## QFN_5_40 [mil]
pads (41):
  oval 24x7.87 smd mask+2: 1(-95,70.87) 2(-95,55.12) 3(-95,39.37) 4(-95,23.62) 5(-95,7.87) 6(-95,-7.87) 7(-95,-23.62) 8(-95,-39.37) 9(-95,-55.12) 10(-95,-70.87) 21(95,-70.87) 22(95,-55.12) 23(95,-39.37) 24(95,-23.62) 25(95,-7.87) 26(95,7.87) 27(95,23.62) 28(95,39.37) 29(95,55.12) 30(95,70.87)
  oval 7.87x24 smd mask+2: 11(-70.87,-95) 12(-55.12,-95) 13(-39.37,-95) 14(-23.62,-95) 15(-7.87,-95) 16(7.87,-95) 17(23.62,-95) 18(39.37,-95) 19(55.12,-95) 20(70.87,-95) 31(70.87,95) 32(55.12,95) 33(39.37,95) 34(23.62,95) 35(7.87,95) 36(-7.87,95) 37(-23.62,95) 38(-39.37,95) 39(-55.12,95) 40(-70.87,95)
  rrect5% 122x122 smd paste-200 mask+2: P(0,0)
Top Layer:
  pour cut-out: -69,82 -71.59,82 -76.36,80.02 -80.02,76.36 -82,71.59 -82,69 -82,-69 -82,-71.59 -80.02,-76.36 -76.36,-80.02 -71.59,-82 -69,-82 69,-82 71.59,-82 76.36,-80.02 80.02,-76.36 82,-71.59 82,-69 82,69 82,71.59 80.02,76.36 76.36,80.02 71.59,82 69,82
  region: -111.26,111.26 -115.5,128.23 -128.23,115.51
Top Paste:
  rectangle: -17,-17 17,17
  rectangle: -17,25 17,59
  rectangle: 25,-17 59,17
  rectangle: 25,25 59,59
  region: -25,25 -25,59 -59,59 -59,25
  region: -25,17 -59,17 -59,-17 -25,-17
  region: -25,-25 -59,-25 -59,-59 -25,-59
  region: -17,-25 -17,-59 17,-59 17,-25
  region: 25,-25 25,-59 59,-59 59,-25
Top Component Outline:
  lines w1: -130,-130 130,-130 130,130 -130,130 -130,-130
Top 3D Body (Mech16):
  lines w1: -98.43,-98.43 -98.43,98.43 98.43,98.43 98.43,-98.43 -98.43,-98.43
3D body: height 10, standoff 0, extent -99,-11.87 -89,-3.87
3D body: height 10, standoff 0, extent -99,3.87 -89,11.87
3D body: height 35, standoff 0, extent -98.43,-98.43 98.43,98.43
3D body: height 10, standoff 0, extent -99,19.62 -89,27.62
3D body: height 10, standoff 0, extent -99,35.37 -89,43.37
3D body: height 10, standoff 0, extent -99,51.12 -89,59.12
3D body: height 10, standoff 0, extent -99,66.87 -89,74.87
3D body: height 10, standoff 0, extent -99,-27.62 -89,-19.62
3D body: height 10, standoff 0, extent -99,-43.37 -89,-35.37
3D body: height 10, standoff 0, extent -99,-59.12 -89,-51.12
3D body: height 10, standoff 0, extent -99,-74.87 -89,-66.87
3D body: height 10, standoff 0, extent 66.87,-99 74.87,-89
3D body: height 10, standoff 0, extent 51.12,-99 59.12,-89
3D body: height 10, standoff 0, extent 35.37,-99 43.37,-89
3D body: height 10, standoff 0, extent 19.62,-99 27.62,-89
3D body: height 10, standoff 0, extent -74.87,-99 -66.87,-89
3D body: height 10, standoff 0, extent -59.12,-99 -51.12,-89
3D body: height 10, standoff 0, extent -43.37,-99 -35.37,-89
3D body: height 10, standoff 0, extent -27.62,-99 -19.62,-89
3D body: height 10, standoff 0, extent -11.87,-99 -3.87,-89
3D body: height 10, standoff 0, extent 3.87,-99 11.87,-89
3D body: height 10, standoff 0, extent 89,66.87 99,74.87
3D body: height 10, standoff 0, extent 89,51.12 99,59.12
3D body: height 10, standoff 0, extent 89,35.37 99,43.37
3D body: height 10, standoff 0, extent 89,19.62 99,27.62
3D body: height 10, standoff 0, extent 89,-74.87 99,-66.87
3D body: height 10, standoff 0, extent 89,-59.12 99,-51.12
3D body: height 10, standoff 0, extent 89,-43.37 99,-35.37
3D body: height 10, standoff 0, extent 89,-27.62 99,-19.62
3D body: height 10, standoff 0, extent 89,-11.87 99,-3.87
3D body: height 10, standoff 0, extent 89,3.87 99,11.87
3D body: height 10, standoff 0, extent -74.87,89 -66.87,99
3D body: height 10, standoff 0, extent -59.12,89 -51.12,99
3D body: height 10, standoff 0, extent -43.37,89 -35.37,99
3D body: height 10, standoff 0, extent -27.62,89 -19.62,99
3D body: height 10, standoff 0, extent 66.87,89 74.87,99
3D body: height 10, standoff 0, extent 51.12,89 59.12,99
3D body: height 10, standoff 0, extent 35.37,89 43.37,99
3D body: height 10, standoff 0, extent 19.62,89 27.62,99
3D body: height 10, standoff 0, extent 3.87,89 11.87,99
3D body: height 10, standoff 0, extent -11.87,89 -3.87,99

## QFN_6_36 [mil]
pads (37):
  oval 31x10 smd mask+2: 1(-110.8,78.74) 2(-110.8,59.05) 3(-110.8,39.37) 4(-110.8,19.68) 5(-110.8,0) 6(-110.8,-19.69) 7(-110.8,-39.37) 8(-110.8,-59.06) 9(-110.8,-78.74) 19(110.8,-78.74) 20(110.8,-59.06) 21(110.8,-39.37) 22(110.8,-19.69) 23(110.8,0) 24(110.8,19.68) 25(110.8,39.37) 26(110.8,59.05) 27(110.8,78.74)
  oval 10x31 smd mask+2: 10(-78.74,-110.8) 11(-59.06,-110.8) 12(-39.37,-110.8) 13(-19.69,-110.8) 14(0,-110.8) 15(19.68,-110.8) 16(39.37,-110.8) 17(59.05,-110.8) 18(78.74,-110.8) 28(78.74,110.8) 29(59.05,110.8) 30(39.37,110.8) 31(19.68,110.8) 32(0,110.8) 33(-19.69,110.8) 34(-39.37,110.8) 35(-59.06,110.8) 36(-78.74,110.8)
  rrect5% 145.67x145.67 smd paste-200 mask+2: P(0,0)
Top Layer:
  region: -126.26,126.26 -130.5,143.23 -143.23,130.51
  pour cut-out: -78.74,96 -82.17,96 -88.52,93.37 -93.37,88.52 -96,82.17 -96,78.74 -96,-78.74 -96,-82.17 -93.37,-88.52 -88.52,-93.37 -82.17,-96 -78.74,-96 78.74,-96 82.17,-96 88.52,-93.37 93.37,-88.52 96,-82.17 96,-78.74 96,78.74 96,82.17 93.37,88.52 88.52,93.37 82.17,96 78.74,96
Top Paste:
  region: 71,-35 35,-35 35,-71 71,-71
  region: 20,20 -20,20 -20,-20 20,-20
  region: 71,20 35,20 35,-20 71,-20
  region: 20,-35 -20,-35 -20,-71 20,-71
  region: -35,-35 -71,-35 -71,-71 -35,-71
  region: -35,20 -71,20 -71,-20 -35,-20
  region: -35,71 -71,71 -71,35 -35,35
  region: 20,71 -20,71 -20,35 20,35
  region: 71,71 35,71 35,35 71,35
Top Component Outline:
  lines w1: -145,-145 145,-145 145,145 -145,145 -145,-145
Top 3D Body (Mech16):
  lines w1: -118.11,-118.11 118.11,-118.11 118.11,118.11 -118.11,118.11 -118.11,-118.11
3D body: height 10, standoff 0, extent 109.11,-83.74 119.11,-73.74
3D body: height 10, standoff 0, extent -64.06,-119.11 -54.06,-109.11
3D body: height 10, standoff 0, extent -119.11,-83.74 -109.11,-73.74
3D body: height 10, standoff 0, extent -64.06,109.11 -54.06,119.11
3D body: height 10, standoff 0, extent -44.37,109.11 -34.37,119.11
3D body: height 10, standoff 0, extent -24.69,109.11 -14.69,119.11
3D body: height 10, standoff 0, extent -5,109.11 5,119.11
3D body: height 10, standoff 0, extent 14.68,109.11 24.68,119.11
3D body: height 10, standoff 0, extent 34.37,109.11 44.37,119.11
3D body: height 10, standoff 0, extent 54.05,109.11 64.05,119.11
3D body: height 10, standoff 0, extent 73.74,109.11 83.74,119.11
3D body: height 10, standoff 0, extent 109.11,54.05 119.11,64.05
3D body: height 10, standoff 0, extent 109.11,34.37 119.11,44.37
3D body: height 10, standoff 0, extent 109.11,14.68 119.11,24.68
3D body: height 10, standoff 0, extent 109.11,-5 119.11,5
3D body: height 10, standoff 0, extent 109.11,-24.69 119.11,-14.69
3D body: height 10, standoff 0, extent 109.11,-44.37 119.11,-34.37
3D body: height 10, standoff 0, extent 109.11,-64.06 119.11,-54.06
3D body: height 10, standoff 0, extent 73.74,-119.11 83.74,-109.11
3D body: height 10, standoff 0, extent 54.05,-119.11 64.05,-109.11
3D body: height 10, standoff 0, extent 34.37,-119.11 44.37,-109.11
3D body: height 10, standoff 0, extent 14.68,-119.11 24.68,-109.11
3D body: height 10, standoff 0, extent -5,-119.11 5,-109.11
3D body: height 10, standoff 0, extent -24.69,-119.11 -14.69,-109.11
3D body: height 10, standoff 0, extent -44.37,-119.11 -34.37,-109.11
3D body: height 10, standoff 0, extent -119.11,-64.06 -109.11,-54.06
3D body: height 10, standoff 0, extent -119.11,-44.37 -109.11,-34.37
3D body: height 10, standoff 0, extent -119.11,-24.69 -109.11,-14.69
3D body: height 10, standoff 0, extent -119.11,54.05 -109.11,64.05
3D body: height 10, standoff 0, extent -119.11,34.37 -109.11,44.37
3D body: height 10, standoff 0, extent -119.11,14.68 -109.11,24.68
3D body: height 10, standoff 0, extent -119.11,-5 -109.11,5
3D body: height 35, standoff 0, extent -118.11,-118.11 118.11,118.11
3D body: height 10, standoff 0, extent -83.74,-119.11 -73.74,-109.11
3D body: height 10, standoff 0, extent -119.11,73.74 -109.11,83.74
3D body: height 10, standoff 0, extent -83.74,109.11 -73.74,119.11
3D body: height 10, standoff 0, extent 109.11,73.74 119.11,83.74

## QFN_6_40 [mil]
pads (41):
  oval 24x10 smd mask+2: 1(-113.69,88.58) 2(-113.69,68.9) 3(-113.69,49.21) 4(-113.69,29.53) 5(-113.69,9.84) 6(-113.69,-9.84) 7(-113.69,-29.53) 8(-113.69,-49.21) 9(-113.69,-68.9) 10(-113.69,-88.58) 21(113.69,-88.58) 22(113.69,-68.9) 23(113.69,-49.21) 24(113.69,-29.53) 25(113.69,-9.84) 26(113.69,9.84) 27(113.69,29.53) 28(113.69,49.21) 29(113.69,68.9) 30(113.69,88.58)
  oval 10x24 smd mask+2: 11(-88.58,-113.69) 12(-68.9,-113.69) 13(-49.21,-113.69) 14(-29.53,-113.69) 15(-9.84,-113.69) 16(9.84,-113.69) 17(29.53,-113.69) 18(49.21,-113.69) 19(68.9,-113.69) 20(88.58,-113.69) 31(88.58,113.69) 32(68.9,113.69) 33(49.21,113.69) 34(29.53,113.69) 35(9.84,113.69) 36(-9.84,113.69) 37(-29.53,113.69) 38(-49.21,113.69) 39(-68.9,113.69) 40(-88.58,113.69)
  rrect5% 161.42x161.42 smd paste-200 mask+2: P(0,0)
Top Layer:
  pour cut-out: -88.63,-101.63 -91.22,-101.63 -95.99,-99.65 -99.65,-95.99 -101.63,-91.22 -101.63,-88.63 -101.63,88.63 -101.63,91.22 -99.65,95.99 -95.99,99.65 -91.22,101.63 -88.63,101.63 88.63,101.63 91.22,101.63 95.99,99.65 99.65,95.99 101.63,91.22 101.63,88.63 101.63,-88.63 101.63,-91.21 99.65,-95.99 95.99,-99.65 91.22,-101.63 88.63,-101.63
  region: -126.26,126.26 -130.5,143.23 -143.23,130.51
Top Paste:
  region: 75,75 35,75 35,35 75,35
  region: 20,75 -20,75 -20,35 20,35
  region: -35,75 -75,75 -75,35 -35,35
  region: -35,20 -75,20 -75,-20 -35,-20
  region: -35,-35 -75,-35 -75,-75 -35,-75
  region: 20,-35 -20,-35 -20,-75 20,-75
  region: 75,20 35,20 35,-20 75,-20
  region: 20,20 -20,20 -20,-20 20,-20
  region: 75,-35 35,-35 35,-75 75,-75
Top Component Outline:
  lines w1: -145,-145 -145,145 145,145 145,-145 -145,-145
Top 3D Body (Mech16):
  lines w1: -118.11,-118.11 -118.11,118.11 118.11,118.11 118.11,-118.11 -118.11,-118.11
3D body: height 35, standoff 0, extent -118.11,-118.11 118.11,118.11
3D body: height 10, standoff 0, extent -119.11,4.84 -109.11,14.84
3D body: height 10, standoff 0, extent -119.11,24.53 -109.11,34.53
3D body: height 10, standoff 0, extent -119.11,44.21 -109.11,54.21
3D body: height 10, standoff 0, extent -119.11,63.9 -109.11,73.9
3D body: height 10, standoff 0, extent -119.11,83.58 -109.11,93.58
3D body: height 10, standoff 0, extent -119.11,-14.84 -109.11,-4.84
3D body: height 10, standoff 0, extent -119.11,-34.53 -109.11,-24.53
3D body: height 10, standoff 0, extent -119.11,-54.21 -109.11,-44.21
3D body: height 10, standoff 0, extent -54.21,-119.11 -44.21,-109.11
3D body: height 10, standoff 0, extent -34.53,-119.11 -24.53,-109.11
3D body: height 10, standoff 0, extent -14.84,-119.11 -4.84,-109.11
3D body: height 10, standoff 0, extent 4.84,-119.11 14.84,-109.11
3D body: height 10, standoff 0, extent 24.53,-119.11 34.53,-109.11
3D body: height 10, standoff 0, extent 44.21,-119.11 54.21,-109.11
3D body: height 10, standoff 0, extent 63.9,-119.11 73.9,-109.11
3D body: height 10, standoff 0, extent 83.58,-119.11 93.58,-109.11
3D body: height 10, standoff 0, extent 109.11,-54.21 119.11,-44.21
3D body: height 10, standoff 0, extent 109.11,-34.53 119.11,-24.53
3D body: height 10, standoff 0, extent 109.11,-14.84 119.11,-4.84
3D body: height 10, standoff 0, extent 109.11,4.84 119.11,14.84
3D body: height 10, standoff 0, extent 109.11,24.53 119.11,34.53
3D body: height 10, standoff 0, extent 109.11,44.21 119.11,54.21
3D body: height 10, standoff 0, extent 109.11,63.9 119.11,73.9
3D body: height 10, standoff 0, extent 109.11,83.58 119.11,93.58
3D body: height 10, standoff 0, extent 83.58,109.11 93.58,119.11
3D body: height 10, standoff 0, extent 63.9,109.11 73.9,119.11
3D body: height 10, standoff 0, extent 44.21,109.11 54.21,119.11
3D body: height 10, standoff 0, extent 24.53,109.11 34.53,119.11
3D body: height 10, standoff 0, extent 4.84,109.11 14.84,119.11
3D body: height 10, standoff 0, extent -14.84,109.11 -4.84,119.11
3D body: height 10, standoff 0, extent -34.53,109.11 -24.53,119.11
3D body: height 10, standoff 0, extent -54.21,109.11 -44.21,119.11
3D body: height 10, standoff 0, extent -73.9,109.11 -63.9,119.11
3D body: height 10, standoff 0, extent -119.11,-73.9 -109.11,-63.9
3D body: height 10, standoff 0, extent -73.9,-119.11 -63.9,-109.11
3D body: height 10, standoff 0, extent 109.11,-73.9 119.11,-63.9
3D body: height 10, standoff 0, extent 109.11,-93.58 119.11,-83.58
3D body: height 10, standoff 0, extent -119.11,-93.58 -109.11,-83.58
3D body: height 10, standoff 0, extent -93.58,-119.11 -83.58,-109.11
3D body: height 10, standoff 0, extent -93.58,109.11 -83.58,119.11

## QFN_7_44_PAD5.1 [mm]
pads (45):
  oval 0.61x0.254 smd mask+0.051: 1(-3.413,2.5) 2(-3.413,2) 3(-3.413,1.5) 4(-3.413,1) 5(-3.413,0.5) 6(-3.413,0) 7(-3.413,-0.5) 8(-3.413,-1) 9(-3.413,-1.5) 10(-3.413,-2) 11(-3.413,-2.5) 23(3.413,-2.5) 24(3.413,-2) 25(3.413,-1.5) 26(3.413,-1) 27(3.413,-0.5) 28(3.413,0) 29(3.413,0.5) 30(3.413,1) 31(3.413,1.5) 32(3.413,2) 33(3.413,2.5)
  oval 0.254x0.61 smd mask+0.051: 12(-2.5,-3.413) 13(-2,-3.413) 14(-1.5,-3.413) 15(-1,-3.413) 16(-0.5,-3.413) 17(0,-3.413) 18(0.5,-3.413) 19(1,-3.413) 20(1.5,-3.413) 21(2,-3.413) 22(2.5,-3.413) 34(2.5,3.413) 35(2,3.413) 36(1.5,3.413) 37(1,3.413) 38(0.5,3.413) 39(0,3.413) 40(-0.5,3.413) 41(-1,3.413) 42(-1.5,3.413) 43(-2,3.413) 44(-2.5,3.413)
  rrect5% 5.1x5.1 smd paste-7.62 mask+0.051: P(0,0)
Top Layer:
  region: -3.842,3.842 -3.95,4.273 -4.273,3.95
  pour cut-out: -2.75,3.099 -2.819,3.099 -2.948,3.046 -3.046,2.948 -3.099,2.819 -3.099,2.75 -3.099,-2.75 -3.099,-2.819 -3.046,-2.948 -2.948,-3.046 -2.819,-3.099 -2.75,-3.099 2.75,-3.099 2.819,-3.099 2.948,-3.046 3.046,-2.948 3.099,-2.819 3.099,-2.75 3.099,2.75 3.099,2.819 3.046,2.948 2.948,3.046 2.819,3.099 2.75,3.099
Top Paste:
  region: 1.016,0.635 1.016,-0.635 2.286,-0.635 2.286,0.635
  region: 1.016,2.286 1.016,1.016 2.286,1.016 2.286,2.286
  region: 0.635,-1.016 -0.635,-1.016 -0.635,-2.286 0.635,-2.286
  region: 2.286,-1.016 1.016,-1.016 1.016,-2.286 2.286,-2.286
  region: -1.016,-0.635 -1.016,0.635 -2.286,0.635 -2.286,-0.635
  region: -1.016,-2.286 -1.016,-1.016 -2.286,-1.016 -2.286,-2.286
  rectangle: -2.286,1.016 -1.016,2.286
  rectangle: -0.635,1.016 0.635,2.286
  rectangle: -0.635,-0.635 0.635,0.635
Top Component Outline:
  lines w0.025: -4.318,-4.318 4.318,-4.318 4.318,4.318 -4.318,4.318 -4.318,-4.318
Top 3D Body (Mech16):
  lines w0.025: -3.5,-3.5 3.5,-3.5 3.5,3.5 -3.5,3.5 -3.5,-3.5
3D body: height 0.25, standoff 0, extent -3.525,2.373 -3.271,2.627
3D body: height 0.89, standoff 0, extent -3.5,-3.5 3.5,3.5
3D body: height 0.25, standoff 0, extent -3.525,1.873 -3.271,2.127
3D body: height 0.25, standoff 0, extent -3.525,1.373 -3.271,1.627
3D body: height 0.25, standoff 0, extent -3.525,0.873 -3.271,1.127
3D body: height 0.25, standoff 0, extent -3.525,0.373 -3.271,0.627
3D body: height 0.25, standoff 0, extent -3.525,-0.127 -3.271,0.127
3D body: height 0.25, standoff 0, extent -3.525,-0.627 -3.271,-0.373
3D body: height 0.25, standoff 0, extent -3.525,-1.127 -3.271,-0.873
3D body: height 0.25, standoff 0, extent -3.525,-1.627 -3.271,-1.373
3D body: height 0.25, standoff 0, extent -3.525,-2.127 -3.271,-1.873
3D body: height 0.25, standoff 0, extent -3.525,-2.627 -3.271,-2.373
3D body: height 0.25, standoff 0, extent 2.373,-3.525 2.627,-3.271
3D body: height 0.25, standoff 0, extent 1.873,-3.525 2.127,-3.271
3D body: height 0.25, standoff 0, extent 1.373,-3.525 1.627,-3.271
3D body: height 0.25, standoff 0, extent 0.873,-3.525 1.127,-3.271
3D body: height 0.25, standoff 0, extent 0.373,-3.525 0.627,-3.271
3D body: height 0.25, standoff 0, extent -0.127,-3.525 0.127,-3.271
3D body: height 0.25, standoff 0, extent -0.627,-3.525 -0.373,-3.271
3D body: height 0.25, standoff 0, extent -1.127,-3.525 -0.873,-3.271
3D body: height 0.25, standoff 0, extent -1.627,-3.525 -1.373,-3.271
3D body: height 0.25, standoff 0, extent -2.127,-3.525 -1.873,-3.271
3D body: height 0.25, standoff 0, extent -2.627,-3.525 -2.373,-3.271
3D body: height 0.25, standoff 0, extent 3.271,2.373 3.525,2.627
3D body: height 0.25, standoff 0, extent 3.271,1.873 3.525,2.127
3D body: height 0.25, standoff 0, extent 3.271,1.373 3.525,1.627
3D body: height 0.25, standoff 0, extent 3.271,0.873 3.525,1.127
3D body: height 0.25, standoff 0, extent 3.271,0.373 3.525,0.627
3D body: height 0.25, standoff 0, extent 3.271,-0.127 3.525,0.127
3D body: height 0.25, standoff 0, extent 3.271,-0.627 3.525,-0.373
3D body: height 0.25, standoff 0, extent 3.271,-1.127 3.525,-0.873
3D body: height 0.25, standoff 0, extent 3.271,-1.627 3.525,-1.373
3D body: height 0.25, standoff 0, extent 3.271,-2.127 3.525,-1.873
3D body: height 0.25, standoff 0, extent 3.271,-2.627 3.525,-2.373
3D body: height 0.25, standoff 0, extent -2.627,3.271 -2.373,3.525
3D body: height 0.25, standoff 0, extent -2.127,3.271 -1.873,3.525
3D body: height 0.25, standoff 0, extent -1.627,3.271 -1.373,3.525
3D body: height 0.25, standoff 0, extent -1.127,3.271 -0.873,3.525
3D body: height 0.25, standoff 0, extent -0.627,3.271 -0.373,3.525
3D body: height 0.25, standoff 0, extent -0.127,3.271 0.127,3.525
3D body: height 0.25, standoff 0, extent 0.373,3.271 0.627,3.525
3D body: height 0.25, standoff 0, extent 0.873,3.271 1.127,3.525
3D body: height 0.25, standoff 0, extent 1.373,3.271 1.627,3.525
3D body: height 0.25, standoff 0, extent 1.873,3.271 2.127,3.525
3D body: height 0.25, standoff 0, extent 2.373,3.271 2.627,3.525